# Altium footprint library klp.PcbLib: 436 footprints (part 8 of 28)
Each footprint in its own frame and in the unit in brackets; x right, y up, seen from the top. Pads: shape width x height; smd on the part's side, far side on the other; paste and mask are expansions set on the pad; w line width, h text height; cw(c..) or ccw(c..) is an arc to the next point about the centre after c.
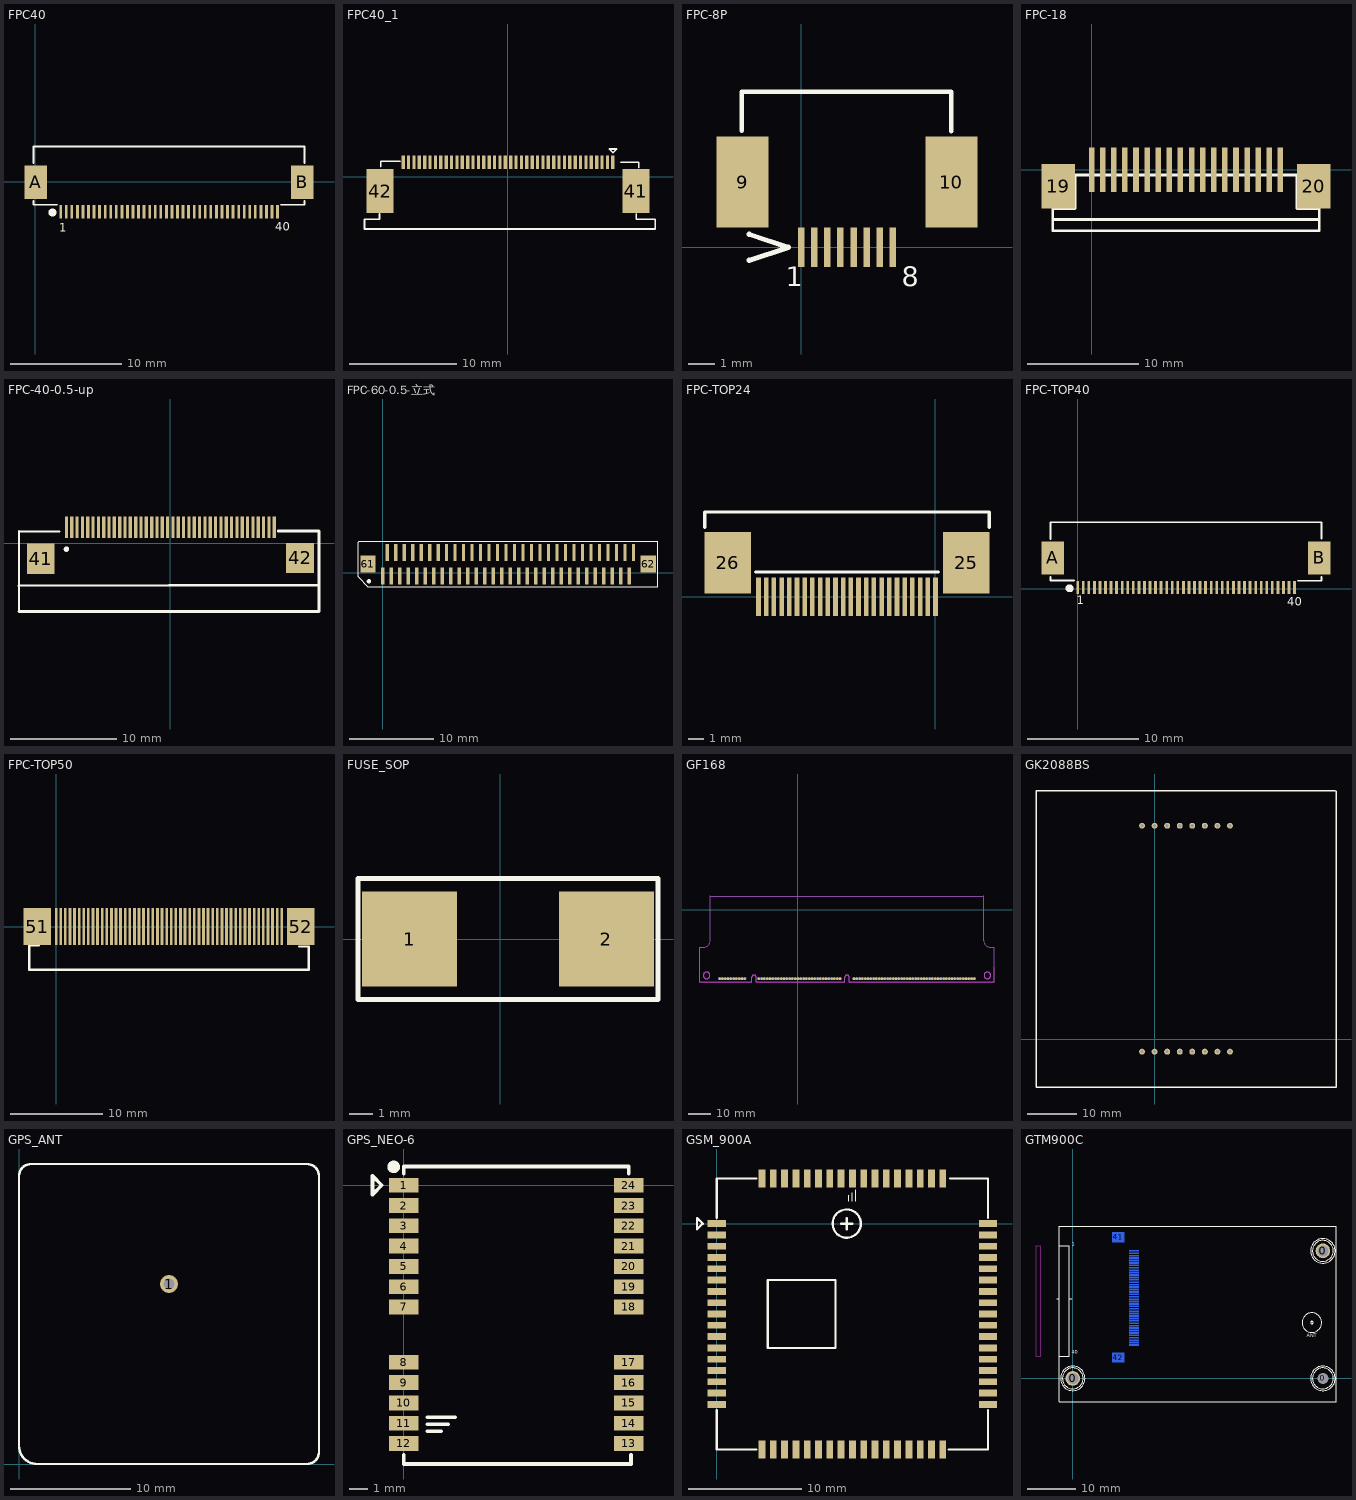
[diagram p7: the footprints below, top view; thin cyan lines are the x and y axes]

## FPC40 [mm]
pads (42):
  rect 0.25x1.2 smd: 1(2.286,-2.692) 2(2.786,-2.692) 3(3.286,-2.692) 4(3.786,-2.692) 5(4.286,-2.692) 6(4.786,-2.692) 7(5.286,-2.692) 8(5.786,-2.692) 9(6.286,-2.692) 10(6.786,-2.692) 11(7.286,-2.692) 12(7.786,-2.692) 13(8.286,-2.692) 14(8.786,-2.692) 15(9.286,-2.692) 16(9.786,-2.692) 17(10.286,-2.692) 18(10.786,-2.692) 19(11.286,-2.692) 20(11.786,-2.692) 21(12.286,-2.692) 22(12.786,-2.692) 23(13.286,-2.692) 24(13.786,-2.692) 25(14.286,-2.692) 26(14.786,-2.692) 27(15.286,-2.692) 28(15.786,-2.692) 29(16.286,-2.692) 30(16.786,-2.692) 31(17.286,-2.692) 32(17.786,-2.692) 33(18.286,-2.692) 34(18.786,-2.692) 35(19.286,-2.692) 36(19.786,-2.692) 37(20.286,-2.692) 38(20.786,-2.692) 39(21.286,-2.692) 40(21.786,-2.692)
  rect 2x3 smd: A(0.036,-0.04) B(24.011,-0.04)
Top Overlay:
  circle w0.356: c1.549,-2.769 r0.178
  lines w0.127: -0.164,-2.063 -0.152,-2.075
  lines w0.152: -0.164,-2.075 1.981,-2.075 ; -0.164,-2.063 -0.164,-1.727 ; -0.164,1.651 -0.164,3.175 24.211,3.175 24.211,1.676 ; 22.08,-2.083 24.211,-2.083 24.211,-1.727
  text "40" at 21.565,-4.414 h0.76
  text "1" at 2.144,-4.485 h0.76

## FPC40_1 [mm]
pads (42):
  rect 0.3x1.25 smd: 1(9.75,1.338) 2(9.25,1.338) 3(8.75,1.338) 4(8.25,1.338) 5(7.75,1.338) 6(7.25,1.338) 7(6.75,1.338) 8(6.25,1.338) 9(5.75,1.338) 10(5.25,1.338) 11(4.75,1.338) 12(4.25,1.338) 13(3.75,1.338) 14(3.25,1.338) 15(2.75,1.338) 16(2.25,1.338) 17(1.75,1.338) 18(1.25,1.338) 19(0.75,1.338) 20(0.25,1.338) 21(-0.25,1.338) 22(-0.75,1.338) 23(-1.25,1.338) 24(-1.75,1.338) 25(-2.25,1.338) 26(-2.75,1.338) 27(-3.25,1.338) 28(-3.75,1.338) 29(-4.25,1.338) 30(-4.75,1.338) 31(-5.25,1.338) 32(-5.75,1.338) 33(-6.25,1.338) 34(-6.75,1.338) 35(-7.25,1.338) 36(-7.75,1.338) 37(-8.25,1.338) 38(-8.75,1.338) 39(-9.25,1.338) 40(-9.75,1.338)
  rect 2.5x4.1 smd: 41(11.9,-1.338) 42(-11.9,-1.338)
Top Overlay:
  lines w0.152: -11.95,-3.463 -11.95,-3.962 -13.35,-3.962 -13.35,-4.862 13.7,-4.862 13.7,-3.942 11.94,-3.942 11.94,-3.463 ; -11.85,0.938 -11.85,1.438 -10.05,1.438 ; 10.47,1.358 12.17,1.358 12.17,0.858 ; 9.413,2.588 9.766,2.234 10.12,2.588 9.413,2.588
3D body "ffc_fpc_affc20-40-050-shb-t.stp": height 2.15, standoff 0.05, extent -12.8,-4.225 12.7,1.111

## FPC-8P [mm]
pads (10):
  rect 0.25x1.5 smd: 1(0,0) 2(0.5,0) 3(1,0) 4(1.5,0) 5(2,0) 6(2.5,0) 7(3,0) 8(3.5,0)
  rect 2x3.5 smd: 9(-2.25,2.5) 10(5.75,2.5)
Top Overlay:
  lines w0.178: -2.286,4.47 -2.286,5.969 5.75,5.969 5.75,4.45
  lines w0.2: -2,-0.5 -0.5,0 -2,0.5
  text "1" at -0.6,-1.5 h0.76
  text "8" at 3.85,-1.5 h0.76

## FPC-18 [mm] "18PIN,0.5MM"
height 1
pads (20):
  rect 0.5x4 smd: 1(0,0) 2(1,0) 3(2,0) 4(3,0) 5(4,0) 6(5,0) 7(6,0) 8(7,0) 9(8,0) 10(9,0) 11(10,0) 12(11,0) 13(12,0) 14(13,0) 15(14,0) 16(15,0) 17(16,0) 18(17,0)
  rect 3x4 smd: 19(-3,-1.5) 20(20,-1.5)
Top Overlay:
  lines w0.254: -3.5,-4.5 20.5,-4.5 ; -3.5,-3.5 -1.5,-3.5 -1.5,-0.5 ; 18.5,-0.5 18.5,-3.5 20.5,-3.5 ; -3.5,-5.5 -3.5,-0.5 20.5,-0.5 20.5,-5.5 -3.5,-5.5

## FPC-40-0.5-up [mm] "CFP, 90-Leads, Body 1.4x5.1mm (max), Pitch 0.50mm, IPC Medium Density"
height 2.5
pads (42):
  rect 0.3x2 smd: 1(-9.761,1.488) 2(-9.261,1.488) 3(-8.761,1.488) 4(-8.261,1.488) 5(-7.761,1.488) 6(-7.261,1.488) 7(-6.761,1.488) 8(-6.261,1.488) 9(-5.761,1.488) 10(-5.261,1.488) 11(-4.761,1.488) 12(-4.261,1.488) 13(-3.761,1.488) 14(-3.261,1.488) 15(-2.761,1.488) 16(-2.261,1.488) 17(-1.761,1.488) 18(-1.261,1.488) 19(-0.761,1.488) 20(-0.261,1.488) 21(0.239,1.488) 22(0.739,1.488) 23(1.239,1.488) 24(1.739,1.488) 25(2.239,1.488) 26(2.739,1.488) 27(3.239,1.488) 28(3.739,1.488) 29(4.239,1.488) 30(4.739,1.488) 31(5.239,1.488) 32(5.739,1.488) 33(6.239,1.488) 34(6.739,1.488) 35(7.239,1.488) 36(7.739,1.488) 37(8.239,1.488) 38(8.739,1.488) 39(9.239,1.488) 40(9.739,1.488)
  rect 2.6x2.85 smd: 41(-12.161,-1.488) 42(12.161,-1.397)
Top Overlay:
  circle w0.25: c-9.759,-0.57 r0.125
  lines w0.2: -14.206,-6.412 -14.206,1.107 -14.18,1.081 -10.396,1.081
  lines w0.254: -14.206,-6.412 13.939,-6.412 13.939,1.081 ; -14.206,-4.001 13.938,-3.937 ; 10.129,1.143 13.939,1.143

## FPC-60-0.5-立式 [mm] "Pitch 0.50mm,"
height 2.65
pads (62):
  rect 0.4x2 smd: 1(0,-0.375) 2(0.5,2.375) 3(1,-0.375) 4(1.5,2.375) 5(2,-0.375) 6(2.5,2.375) 7(3,-0.375) 8(3.5,2.375) 9(4,-0.375) 10(4.5,2.375) 11(5,-0.375) 12(5.5,2.375) 13(6,-0.375) 14(6.5,2.375) 15(7,-0.375) 16(7.5,2.375) 17(8,-0.375) 18(8.5,2.375) 19(9,-0.375) 20(9.5,2.375) 21(10,-0.375) 22(10.5,2.375) 23(11,-0.375) 24(11.5,2.375) 25(12,-0.375) 26(12.5,2.375) 27(13,-0.375) 28(13.5,2.375) 29(14,-0.375) 30(14.5,2.375) 31(15,-0.375) 32(15.5,2.375) 33(16,-0.375) 34(16.5,2.375) 35(17,-0.375) 36(17.5,2.375) 37(18,-0.375) 38(18.5,2.375) 39(19,-0.375) 40(19.5,2.375) 41(20,-0.375) 42(20.5,2.375) 43(21,-0.375) 44(21.5,2.375) 45(22,-0.375) 46(22.5,2.375) 47(23,-0.375) 48(23.5,2.375) 49(24,-0.375) 50(24.5,2.375) 51(25,-0.375) 52(25.5,2.375) 53(26,-0.375) 54(26.5,2.375) 55(27,-0.375) 56(27.5,2.375) 57(28,-0.375) 58(28.5,2.375) 59(29,-0.375) 60(29.5,2.375)
  rect 1.8x2 smd: 61(-1.75,1) 62(31.25,1)
Top Overlay:
  circle w0.25: c-1.649,-1.016 r0.125
  lines w0.127: -2.921,-0.508 -1.778,-1.651 32.385,-1.651 32.385,3.683 -2.794,3.683 -2.826,3.651 -2.889,3.588 -2.921,3.556 -2.921,-0.508

## FPC-TOP24 [mm] "FPCTOP;0.5mm;"
height 1
pads (26):
  rect 0.3x2.5 smd: 1(0,0) 2(-0.5,0) 3(-1,0) 4(-1.5,0) 5(-2,0) 6(-2.5,0) 7(-3,0) 8(-3.5,0) 9(-4,0) 10(-4.5,0) 11(-5,0) 12(-5.5,0) 13(-6,0) 14(-6.5,0) 15(-7,0) 16(-7.5,0) 17(-8,0) 18(-8.5,0) 19(-9,0) 20(-9.5,0) 21(-10,0) 22(-10.5,0) 23(-11,0) 24(-11.5,0)
  rect 3x4 smd: 25(2,2.2) 26(-13.5,2.2)
Top Overlay:
  lines w0.203: -15,4.5 -15,5.5 3.5,5.5 3.5,4.6 3.5,4.5 ; -11.7,1.6 0.2,1.6

## FPC-TOP40 [mm]
pads (42):
  rect 0.25x1.2 smd: 1(0,0.102) 2(0.5,0.102) 3(1,0.102) 4(1.5,0.102) 5(2,0.102) 6(2.5,0.102) 7(3,0.102) 8(3.5,0.102) 9(4,0.102) 10(4.5,0.102) 11(5,0.102) 12(5.5,0.102) 13(6,0.102) 14(6.5,0.102) 15(7,0.102) 16(7.5,0.102) 17(8,0.102) 18(8.5,0.102) 19(9,0.102) 20(9.5,0.102) 21(10,0.102) 22(10.5,0.102) 23(11,0.102) 24(11.5,0.102) 25(12,0.102) 26(12.5,0.102) 27(13,0.102) 28(13.5,0.102) 29(14,0.102) 30(14.5,0.102) 31(15,0.102) 32(15.5,0.102) 33(16,0.102) 34(16.5,0.102) 35(17,0.102) 36(17.5,0.102) 37(18,0.102) 38(18.5,0.102) 39(19,0.102) 40(19.5,0.102)
  rect 2x3 smd: A(-2.25,2.754) B(21.725,2.754)
Top Overlay:
  circle w0.356: c-0.737,0.025 r0.178
  lines w0.127: -2.45,0.731 -2.438,0.719
  lines w0.152: -2.45,0.719 -0.305,0.719 ; -2.45,0.731 -2.45,1.067 ; -2.45,4.445 -2.45,5.969 21.925,5.969 21.925,4.47 ; 19.794,0.711 21.925,0.711 21.925,1.067
  text "40" at 18.847,-1.549 h0.76
  text "1" at -0.102,-1.397 h0.76

## FPC-TOP50 [mm] "FPCTOP;0.5mm;"
height 1
pads (52):
  rect 0.3x4 smd: 1(24.5,0) 2(24,0) 3(23.5,0) 4(23,0) 5(22.5,0) 6(22,0) 7(21.5,0) 8(21,0) 9(20.5,0) 10(20,0) 11(19.5,0) 12(19,0) 13(18.5,0) 14(18,0) 15(17.5,0) 16(17,0) 17(16.5,0) 18(16,0) 19(15.5,0) 20(15,0) 21(14.5,0) 22(14,0) 23(13.5,0) 24(13,0) 25(12.5,0) 26(12,0) 27(11.5,0) 28(11,0) 29(10.5,0) 30(10,0) 31(9.5,0) 32(9,0) 33(8.5,0) 34(8,0) 35(7.5,0) 36(7,0) 37(6.5,0) 38(6,0) 39(5.5,0) 40(5,0) 41(4.5,0) 42(4,0) 43(3.5,0) 44(3,0) 45(2.5,0) 46(2,0) 47(1.5,0) 48(1,0) 49(0.5,0) 50(0,0)
  rect 3x4 smd: 51(-2.032,0) 52(26.543,0)
Top Overlay:
  lines w0.254: -1.905,-2.032 -2.921,-2.032 -2.921,-4.699 27.432,-4.699 27.432,-2.159 26.416,-2.159

## FUSE_SOP [mm] "4A;SOP;FUSE;W:5mm;L:12mm;"
height 2
pads (2):
  rect 4x4 smd: 1(-3.81,0) 2(4.445,0)
Top Overlay:
  lines w0.2: -5.969,-2.54 6.604,-2.54 6.604,2.54 -4.699,2.54 -5.969,2.54 -5.969,-2.54

## GF168 [mm] "PORT"
height 50
pads (168):
  oct 1.2x1.2 smd: A1(-35.382,-31.242) A2(-34.112,-31.242) A3(-32.842,-31.242) A4(-31.572,-31.242) A5(-30.302,-31.242) A6(-29.032,-31.242) A7(-27.762,-31.242) A8(-26.492,-31.242) A9(-25.222,-31.242) A10(-23.952,-31.242) A11(-17.602,-31.242) A12(-16.332,-31.242) A13(-15.062,-31.242) A14(-13.792,-31.242) A15(-12.522,-31.242) A16(-11.252,-31.242) A17(-9.982,-31.242) A18(-8.712,-31.242) A19(-7.442,-31.242) A20(-6.172,-31.242) A21(-4.902,-31.242) A22(-3.632,-31.242) A23(-2.362,-31.242) A24(-1.092,-31.242) A25(0.178,-31.242) A26(1.448,-31.242) A27(2.718,-31.242) A28(3.988,-31.242) A29(5.258,-31.242) A30(6.528,-31.242) A31(7.798,-31.242) A32(9.068,-31.242) A33(10.338,-31.242) A34(11.608,-31.242) A35(12.878,-31.242) A36(14.148,-31.242) A37(15.418,-31.242) A38(16.688,-31.242) A39(17.958,-31.242) A40(19.228,-31.242) A41(25.578,-31.242) A42(26.848,-31.242) A43(28.118,-31.242) A44(29.388,-31.242) A45(30.658,-31.242) A46(31.928,-31.242) A47(33.198,-31.242) A48(34.468,-31.242) A49(35.738,-31.242) A50(37.008,-31.242) A51(38.278,-31.242) A52(39.548,-31.242) A53(40.818,-31.242) A54(42.088,-31.242) A55(43.358,-31.242) A56(44.628,-31.242) A57(45.898,-31.242) A58(47.168,-31.242) A59(48.438,-31.242) A60(49.708,-31.242) A61(50.978,-31.242) A62(52.248,-31.242) A63(53.518,-31.242) A64(54.788,-31.242) A65(56.058,-31.242) A66(57.328,-31.242) A67(58.598,-31.242) A68(59.868,-31.242) A69(61.138,-31.242) A70(62.408,-31.242) A71(63.678,-31.242) A72(64.948,-31.242) A73(66.218,-31.242) A74(67.488,-31.242) A75(68.758,-31.242) A76(70.028,-31.242) A77(71.298,-31.242) A78(72.568,-31.242) A79(73.838,-31.242) A80(75.108,-31.242) A81(76.378,-31.242) A82(77.648,-31.242) A83(78.918,-31.242) A84(80.188,-31.242)
  oct 1.2x1.2 smd far side: B1(-35.382,-31.242) B2(-34.112,-31.242) B3(-32.842,-31.242) B4(-31.572,-31.242) B5(-30.302,-31.242) B6(-29.032,-31.242) B7(-27.762,-31.242) B8(-26.492,-31.242) B9(-25.222,-31.242) B10(-23.952,-31.242) B11(-17.602,-31.242) B12(-16.332,-31.242) B13(-15.062,-31.242) B14(-13.792,-31.242) B15(-12.522,-31.242) B16(-11.252,-31.242) B17(-9.982,-31.242) B18(-8.712,-31.242) B19(-7.442,-31.242) B20(-6.172,-31.242) B21(-4.902,-31.242) B22(-3.632,-31.242) B23(-2.362,-31.242) B24(-1.092,-31.242) B25(0.178,-31.242) B26(1.448,-31.242) B27(2.718,-31.242) B28(3.988,-31.242) B29(5.258,-31.242) B30(6.528,-31.242) B31(7.798,-31.242) B32(9.068,-31.242) B33(10.338,-31.242) B34(11.608,-31.242) B35(12.878,-31.242) B36(14.148,-31.242) B37(15.418,-31.242) B38(16.688,-31.242) B39(17.958,-31.242) B40(19.228,-31.242) B41(25.578,-31.242) B42(26.848,-31.242) B43(28.118,-31.242) B44(29.388,-31.242) B45(30.658,-31.242) B46(31.928,-31.242) B47(33.198,-31.242) B48(34.468,-31.242) B49(35.738,-31.242) B50(37.008,-31.242) B51(38.278,-31.242) B52(39.548,-31.242) B53(40.818,-31.242) B54(42.088,-31.242) B55(43.358,-31.242) B56(44.628,-31.242) B57(45.898,-31.242) B58(47.168,-31.242) B59(48.438,-31.242) B60(49.708,-31.242) B61(50.978,-31.242) B62(52.248,-31.242) B63(53.518,-31.242) B64(54.788,-31.242) B65(56.058,-31.242) B66(57.328,-31.242) B67(58.598,-31.242) B68(59.868,-31.242) B69(61.138,-31.242) B70(62.408,-31.242) B71(63.678,-31.242) B72(64.948,-31.242) B73(66.218,-31.242) B74(67.488,-31.242) B75(68.758,-31.242) B76(70.028,-31.242) B77(71.298,-31.242) B78(72.568,-31.242) B79(73.838,-31.242) B80(75.108,-31.242) B81(76.378,-31.242) B82(77.648,-31.242) B83(78.918,-31.242) B84(80.188,-31.242)
Keep-Out Layer:
  circle w0.254: c-41.272,-29.777 r1.5
  circle w0.254: c86.078,-29.777 r1.5
  lines w0.254: -44.348,-17.82 -44.348,-17.058 -44.323,-17.033 -42.672,-17.033 ; -44.347,-22.9 -44.347,-17.083 ; -44.347,-22.622 -44.347,-32.777 -23.952,-32.777 -20.777,-32.777 -20.777,-30.657 cw(c-19.777,-30.657) -18.777,-30.657 -18.777,-32.777 21.403,-32.777 21.403,-30.657 cw(c22.403,-30.657) 23.403,-30.657 23.403,-32.777 89.153,-32.777 89.153,-25.95
Mechanical 1:
  circle w0.254: c-41.272,-29.762 r1.5
  circle w0.254: c86.078,-29.762 r1.5
  lines w0.254: -44.348,-17.805 -44.348,-17.043 -44.323,-17.018 -42.672,-17.018 ; -44.347,-22.885 -44.347,-17.068 ; -44.347,-22.607 -44.347,-32.762 -23.952,-32.762 -20.777,-32.762 -20.777,-30.642 cw(c-19.777,-30.642) -18.777,-30.642 -18.777,-32.762 21.403,-32.762 21.403,-30.642 cw(c22.403,-30.642) 23.403,-30.642 23.403,-32.762 89.153,-32.762 89.153,-25.935 ; -42.649,-17.021 ccw(c-42.649,-14.021) -39.649,-14.021 -39.649,6.248 ; -39.597,6.238 84.403,6.238 ; 84.43,-14.021 84.43,6.248 ; 84.455,-14.021 ccw(c87.455,-14.021) 87.455,-17.021 ; 87.274,-17.018 89.103,-17.018 ; 89.153,-26.238 89.153,-16.991

## GK2088BS [mm] "GK2088BS"
height 8
pads (16):
  round 1.2 hole 0.635: 1(-2.54,-2.54) 2(0,-2.54) 3(2.54,-2.54) 4(5.08,-2.54) 5(7.62,-2.54) 6(10.16,-2.54) 7(12.7,-2.54) 8(15.24,-2.54) 9(15.24,43.18) 10(12.7,43.18) 11(10.16,43.18) 12(7.62,43.18) 13(5.08,43.18) 14(2.54,43.18) 15(0,43.18) 16(-2.54,43.18)
Top Overlay:
  lines w0.254: -24.003,47.752 -24.003,50.292 -10.16,50.292 ; -24.003,48.895 -24.003,-6.35 -24.003,-9.779 -13.462,-9.779 ; -13.716,-9.779 19.812,-9.779 ; -11.303,50.292 28.829,50.292 36.576,50.292 36.703,50.165 36.703,45.847 ; 19.177,-9.779 33.274,-9.779 ; 32.385,-9.779 36.703,-9.779 36.703,-6.223 36.703,46.736

## GPS_ANT [mm]
pads (1):
  round 1.5 hole 0.9: 1(12.5,15)
Top Overlay:
  lines w0.203: 0.9,25 24,25 cw(c24,24) 25,24 25,1 cw(c24,1) 24,0 1.5,0 cw(c1.5,1.5) 0,1.5 0,24 cw(c1,24) 1,25

## GPS_NEO-6 [mm]
pads (24):
  rect 1.6x0.8 smd: 1(0,0) 2(0,-1.1) 3(0,-2.2) 4(0,-3.3) 5(0,-4.4) 6(0,-5.5) 7(0,-6.6) 8(0,-9.6) 9(0,-10.7) 10(0,-11.8) 11(0,-12.9) 12(0,-14) 13(12.2,-14) 14(12.2,-12.9) 15(12.2,-11.8) 16(12.2,-10.7) 17(12.2,-9.6) 18(12.2,-6.6) 19(12.2,-5.5) 20(12.2,-4.4) 21(12.2,-3.3) 22(12.2,-2.2) 23(12.2,-1.1) 24(12.2,0)
Top Overlay:
  circle w0.381: c-0.552,1 r0.152
  lines w0.152: -1.7,-0.5 -1.2,0 -1.7,0.5 -1.7,-0.5
  lines w0.203: 0,-14.605 0,-15.113 12.319,-15.113 12.319,-14.605 ; 0,0.635 0,1.016 12.192,1.016 12.192,0.635 ; 1.27,-13.335 2.032,-13.335 ; 1.27,-12.954 2.413,-12.954 ; 1.27,-12.573 2.794,-12.573 ; -1.2,0 -1.7,0.5 -1.7,-0.5 -1.2,0 ; -1.2,0 -1.2,0

## GSM_900A [mm]
pads (68):
  rect 1.6x0.6 smd: 1(0,0) 2(0,-1) 3(0,-2) 4(0,-3) 5(0,-4) 6(0,-5) 7(0,-6) 8(0,-7) 9(0,-8) 10(0,-9) 11(0,-10) 12(0,-11) 13(0,-12) 14(0,-13) 15(0,-14) 16(0,-15) 17(0,-16) 35(24,-16) 36(24,-15) 37(24,-14) 38(24,-13) 39(24,-12) 40(24,-11) 41(24,-10) 42(24,-9) 43(24,-8) 44(24,-7) 45(24,-6) 46(24,-5) 47(24,-4) 48(24,-3) 49(24,-2) 50(24,-1) 51(24,0)
  rect 0.6x1.6 smd: 18(4,-20) 19(5,-20) 20(6,-20) 21(7,-20) 22(8,-20) 23(9,-20) 24(10,-20) 25(11,-20) 26(12,-20) 27(13,-20) 28(14,-20) 29(15,-20) 30(16,-20) 31(17,-20) 32(18,-20) 33(19,-20) 34(20,-20) 52(20,4) 53(19,4) 54(18,4) 55(17,4) 56(16,4) 57(15,4) 58(14,4) 59(13,4) 60(12,4) 61(11,4) 62(10,4) 63(9,4) 64(8,4) 65(7,4) 66(6,4) 67(5,4) 68(4,4)
Top Overlay:
  circle w0.203: c11.5,0 r1.25
  lines w0.1: 11.7,2 11.7,2.5 ; 12,2 12,2.75 ; 12.3,2 12.3,3 ; -1.75,-0.5 -1.75,0.5 -1.25,0 -1.75,-0.5
  lines w0.203: 0,-16.51 0,-20 3.495,-20 ; 0,0.508 0,4 3.493,4 ; 11,0 12,0 ; 11.5,-0.5 11.5,0.5 ; 20.508,-20 24,-20 24,-16.513 ; 20.637,4 24,4 24,0.511 ; -1.75,-0.5 -1.25,0 -1.75,0.5 -1.75,-0.5 ; 4.5,-11 4.5,-5 10.5,-5 10.5,-11 4.5,-11

## GTM900C [mil] "HW,GTM900C"
height 393.7
pads (45):
  round 120 hole 90: 0(0,1) 0(2040,1041)
  round 78.74 hole 90: 0(2040,1)
  rect 80x10 smd far side: 1(500,1041) 2(500,1021.32) 3(500,1001.63) 4(500,981.94) 5(500,962.26) 6(500,942.57) 7(500,922.89) 8(500,903.2) 9(500,883.52) 10(500,863.83) 11(500,844.15) 12(500,824.46) 13(500,804.78) 14(500,785.09) 15(500,765.41) 16(500,745.72) 17(500,726.04) 18(500,706.35) 19(500,686.67) 20(500,666.98) 21(500,647.3) 22(500,627.61) 23(500,607.93) 24(500,588.24) 25(500,568.56) 26(500,548.87) 27(500,529.19) 28(500,509.5) 29(500,489.82) 30(500,470.13) 31(500,450.45) 32(500,430.76) 33(500,411.08) 34(500,391.39) 35(500,371.71) 36(500,352.02) 37(500,332.34) 38(500,312.65) 39(500,292.97) 40(500,273.28)
  rect 100x80 smd far side: 41(370,1151) 42(370,171)
Top Overlay:
  circle w7: c2040,1041 r100
  circle w7: c2040,1 r100
  circle w4: c1950,456 r10
  circle w7: c1950,456 r80
  circle w7: c0,1 r100
  circle w7: c0,1 r85
  circle w7: c2040,1 r85
  circle w7: c2040,1041 r85
  lines w7: -130,651 -110,651 ; -110,181 -30,181 -30,201 -30,1081 -110,1081 ; -30,651 -10,651 ; -110,-189 2147,-189 2147,1241 -110,1241 -110,-189
  text "ANT" at 1910,336 h30
  text "1" at -10,1081 h30
  text "40" at -10,201 h30
Bottom Overlay:
  lines w7: 240,661 260,661 ; 315,171 240,171 240,1141 240,1151 315,1151 ; 425,171 500,171 500,261 ; 425,1151 500,1151 500,1066
  text "40" at 520,193.28 h30
  text "1" at 510,1073.28 h30
Keep-Out Layer:
  lines w10: -300,181 -300,1081 -260,1081 -260,181 -300,181